# Altium footprint library BARKO_PCBLIB.PcbLib: 531 footprints (part 33 of 34)
Each footprint in its own frame and in the unit in brackets; x right, y up, seen from the top. Pads: shape width x height; smd on the part's side, far side on the other; paste and mask are expansions set on the pad; w line width, h text height; cw(c..) or ccw(c..) is an arc to the next point about the centre after c.
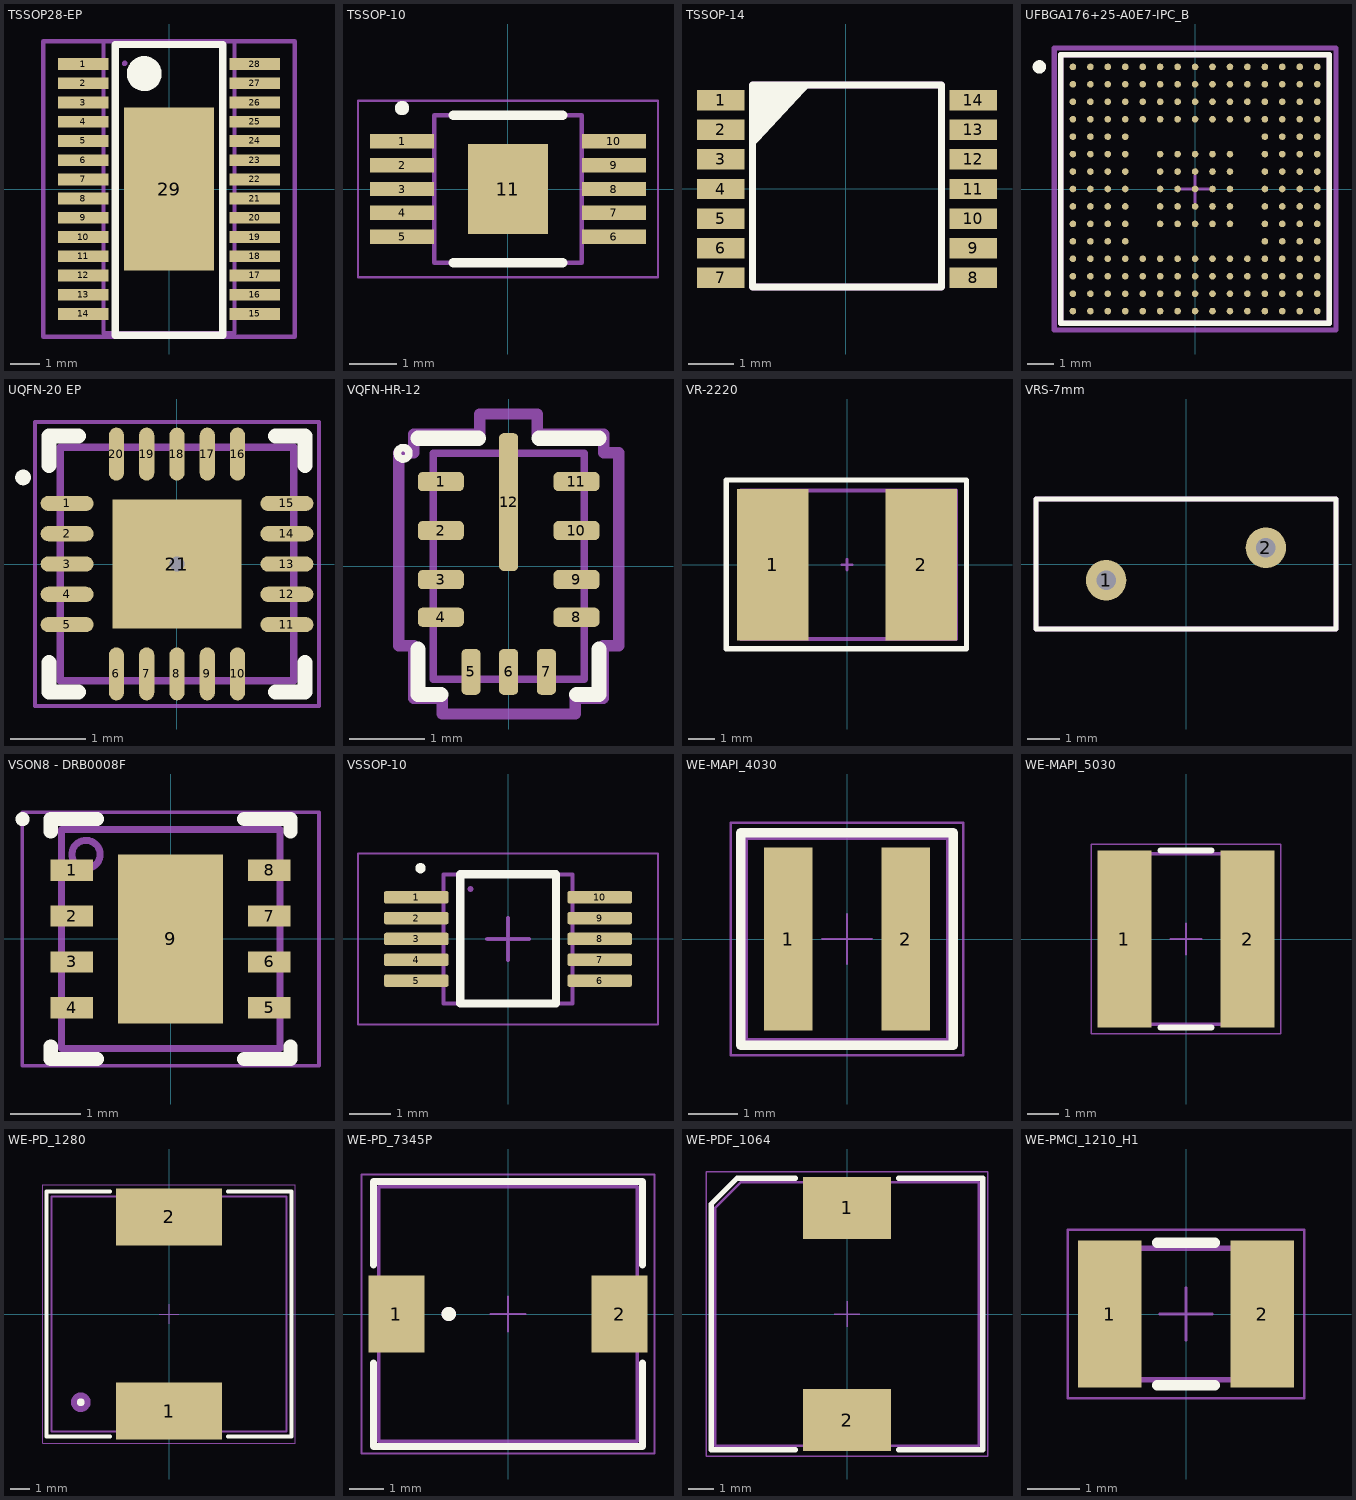
[diagram p32: the footprints below, top view; thin cyan lines are the x and y axes]

## TSSOP28-EP [mil]
height 47.24
pads (29):
  rect 68x16 smd mask+1.97: 1(-116,169) 2(-116,143) 3(-116,117) 4(-116,91) 5(-116,65) 6(-116,39) 7(-116,13) 8(-116,-13) 9(-116,-39) 10(-116,-65) 11(-116,-91) 12(-116,-117) 13(-116,-143) 14(-116,-169) 15(116,-169) 16(116,-143) 17(116,-117) 18(116,-91) 19(116,-65) 20(116,-39) 21(116,-13) 22(116,13) 23(116,39) 24(116,65) 25(116,91) 26(116,117) 27(116,143) 28(116,169)
  rect 122x220 smd paste-109.5 mask+1.97: 29(0,0)
Top Overlay:
  circle w23.62: c-33.46,156.14 r11.81
  lines w10: -72.83,-198 -72.83,195.51 72.83,195.51 72.83,-198 -72.83,-198
Top Paste:
  region: 57.06,-58.94 3.94,-58.94 3.94,-106.06 57.06,-106.06
  region: 57.06,-3.94 3.94,-3.94 3.94,-51.06 57.06,-51.06
  region: 57.06,51.06 3.94,51.06 3.94,3.94 57.06,3.94
  region: 57.06,106.06 3.94,106.06 3.94,58.94 57.06,58.94
  region: -3.94,-58.94 -57.06,-58.94 -57.06,-106.06 -3.94,-106.06
  region: -3.94,-3.94 -57.06,-3.94 -57.06,-51.06 -3.94,-51.06
  region: -3.94,51.06 -57.06,51.06 -57.06,3.94 -3.94,3.94
  region: -3.94,106.06 -57.06,106.06 -57.06,58.94 -3.94,58.94
Mechanical 15:
  lines w6: -170,-200 -108.5,-200 108.5,-200 170,-200 170,200 108.5,200 -108.5,200 -170,200 -170,-200
ASM Top:
  circle w5: c-59.99,170 r1.17
  lines w5: -88.58,-195 88.58,-195 88.58,200 -88.58,200 -88.58,-195
  text ".designator" at -30.5,-3.94 h31.5
3D body "TSSOP28-EP.step": height 47.24, standoff 0, extent -130.32,-192.91 130.32,192.92

## TSSOP-10 [mm] "TSSOP, 10-Leads, Body 3,00x3,00mm, Pitch 0,50mm, Thermal Pad 1,89x1,69mm, IPC Medium Density"
height 1.1
pads (11):
  rect 1.35x0.3 smd mask+0.051: 1(-2.225,1) 2(-2.225,0.5) 3(-2.225,0) 4(-2.225,-0.5) 5(-2.225,-1) 6(2.225,-1) 7(2.225,-0.5) 8(2.225,0) 9(2.225,0.5) 10(2.225,1)
  rect 1.69x1.89 smd mask+0.051: 11(0,0)
Top Overlay:
  circle w0.25: c-2.225,1.7 r0.025
  lines w0.2: -1.15,-1.55 1.15,-1.55 ; -1.15,1.55 1.15,1.55
Mechanical 15:
  lines w0.05: -3.15,-1.85 -3.15,1.85 3.15,1.85 3.15,-1.85 -3.15,-1.85
  lines w0.1: -0.5,0 0.5,0 ; 0,-0.5 0,0.5
ASM Top:
  circle w0.1: c-0.65,0.65 r0.025
  lines w0.1: -1.55,-1.55 -1.55,1.55 1.55,1.55 1.55,-1.55 -1.55,-1.55
  text ".designator" at -0.25,-0.1 h1.2
3D body "User Library-AD5170BRMZ100-ND.STEP": height 0.97, standoff -0.03, extent -2.463,-1.5 2.464,1.5

## TSSOP-14 [mm]
pads (14):
  rect 1.05x0.45 smd mask+0.051: 1(-2.749,1.939) 2(-2.749,1.289) 3(-2.749,0.639) 4(-2.749,-0.011) 5(-2.749,-0.661) 6(-2.749,-1.311) 7(-2.749,-1.961) 8(2.801,-1.961) 9(2.801,-1.311) 10(2.801,-0.661) 11(2.801,-0.011) 12(2.801,0.639) 13(2.801,1.289) 14(2.801,1.939)
Top Overlay:
  region: -0.786,2.275 -2.057,2.275 -2.057,0.901
  lines w0.152: -2.057,-2.17 -2.057,2.275 2.109,2.275 2.109,-2.17 -2.057,-2.17
ASM Top:
  lines w0.152: -2.057,-2.17 2.109,-2.17 2.109,2.275 -2.057,2.275 -2.057,-2.17
  text ".designator" at -0.2,-0.1 h0.8
3D body "TSSOP-14.STEP": height 1.21, standoff 0.01, extent -3.2,-2.5 3.2,2.5

## UFBGA176+25-A0E7-IPC_B [mm]
pads (201):
  round 0.246 smd paste+0 mask+0.05: A1(-4.55,4.55) A2(-3.9,4.55) A3(-3.25,4.55) A4(-2.6,4.55) A5(-1.95,4.55) A6(-1.3,4.55) A7(-0.65,4.55) A8(0,4.55) A9(0.65,4.55) A10(1.3,4.55) A11(1.95,4.55) A12(2.6,4.55) A13(3.25,4.55) A14(3.9,4.55) A15(4.55,4.55) B1(-4.55,3.9) B2(-3.9,3.9) B3(-3.25,3.9) B4(-2.6,3.9) B5(-1.95,3.9) B6(-1.3,3.9) B7(-0.65,3.9) B8(0,3.9) B9(0.65,3.9) B10(1.3,3.9) B11(1.95,3.9) B12(2.6,3.9) B13(3.25,3.9) B14(3.9,3.9) B15(4.55,3.9) C1(-4.55,3.25) C2(-3.9,3.25) C3(-3.25,3.25) C4(-2.6,3.25) C5(-1.95,3.25) C6(-1.3,3.25) C7(-0.65,3.25) C8(0,3.25) C9(0.65,3.25) C10(1.3,3.25) C11(1.95,3.25) C12(2.6,3.25) C13(3.25,3.25) C14(3.9,3.25) C15(4.55,3.25) D1(-4.55,2.6) D2(-3.9,2.6) D3(-3.25,2.6) D4(-2.6,2.6) D5(-1.95,2.6) D6(-1.3,2.6) D7(-0.65,2.6) D8(0,2.6) D9(0.65,2.6) D10(1.3,2.6) D11(1.95,2.6) D12(2.6,2.6) D13(3.25,2.6) D14(3.9,2.6) D15(4.55,2.6) E1(-4.55,1.95) E2(-3.9,1.95) E3(-3.25,1.95) E4(-2.6,1.95) E12(2.6,1.95) E13(3.25,1.95) E14(3.9,1.95) E15(4.55,1.95) F1(-4.55,1.3) F2(-3.9,1.3) F3(-3.25,1.3) F4(-2.6,1.3) F6(-1.3,1.3) F7(-0.65,1.3) F8(0,1.3) F9(0.65,1.3) F10(1.3,1.3) F12(2.6,1.3) F13(3.25,1.3) F14(3.9,1.3) F15(4.55,1.3) G1(-4.55,0.65) G2(-3.9,0.65) G3(-3.25,0.65) G4(-2.6,0.65) G6(-1.3,0.65) G7(-0.65,0.65) G8(0,0.65) G9(0.65,0.65) G10(1.3,0.65) G12(2.6,0.65) G13(3.25,0.65) G14(3.9,0.65) G15(4.55,0.65) H1(-4.55,0) H2(-3.9,0) H3(-3.25,0) H4(-2.6,0) H6(-1.3,0) H7(-0.65,0) H8(0,0) H9(0.65,0) H10(1.3,0) H12(2.6,0) H13(3.25,0) H14(3.9,0) H15(4.55,0) J1(-4.55,-0.65) J2(-3.9,-0.65) J3(-3.25,-0.65) J4(-2.6,-0.65) J6(-1.3,-0.65) J7(-0.65,-0.65) J8(0,-0.65) J9(0.65,-0.65) J10(1.3,-0.65) J12(2.6,-0.65) J13(3.25,-0.65) J14(3.9,-0.65) J15(4.55,-0.65) K1(-4.55,-1.3) K2(-3.9,-1.3) K3(-3.25,-1.3) K4(-2.6,-1.3) K6(-1.3,-1.3) K7(-0.65,-1.3) K8(0,-1.3) K9(0.65,-1.3) K10(1.3,-1.3) K12(2.6,-1.3) K13(3.25,-1.3) K14(3.9,-1.3) K15(4.55,-1.3) L1(-4.55,-1.95) L2(-3.9,-1.95) L3(-3.25,-1.95) L4(-2.6,-1.95) L12(2.6,-1.95) L13(3.25,-1.95) L14(3.9,-1.95) L15(4.55,-1.95) M1(-4.55,-2.6) M2(-3.9,-2.6) M3(-3.25,-2.6) M4(-2.6,-2.6) M5(-1.95,-2.6) M6(-1.3,-2.6) M7(-0.65,-2.6) M8(0,-2.6) M9(0.65,-2.6) M10(1.3,-2.6) M11(1.95,-2.6) M12(2.6,-2.6) M13(3.25,-2.6) M14(3.9,-2.6) M15(4.55,-2.6) N1(-4.55,-3.25) N2(-3.9,-3.25) N3(-3.25,-3.25) N4(-2.6,-3.25) N5(-1.95,-3.25) N6(-1.3,-3.25) N7(-0.65,-3.25) N8(0,-3.25) N9(0.65,-3.25) N10(1.3,-3.25) N11(1.95,-3.25) N12(2.6,-3.25) N13(3.25,-3.25) N14(3.9,-3.25) N15(4.55,-3.25) P1(-4.55,-3.9) P2(-3.9,-3.9) P3(-3.25,-3.9) P4(-2.6,-3.9) P5(-1.95,-3.9) P6(-1.3,-3.9) P7(-0.65,-3.9) P8(0,-3.9) P9(0.65,-3.9) P10(1.3,-3.9) P11(1.95,-3.9) P12(2.6,-3.9) P13(3.25,-3.9) P14(3.9,-3.9) P15(4.55,-3.9) R1(-4.55,-4.55) R2(-3.9,-4.55) R3(-3.25,-4.55) R4(-2.6,-4.55) R5(-1.95,-4.55) R6(-1.3,-4.55) R7(-0.65,-4.55) R8(0,-4.55) R9(0.65,-4.55) R10(1.3,-4.55) R11(1.95,-4.55) R12(2.6,-4.55) R13(3.25,-4.55) R14(3.9,-4.55) R15(4.55,-4.55)
Top Overlay:
  circle w0.25: c-5.8,4.55 r0.125
  lines w0.2: -5,-5 -5,5 5,5 5,-5 -5,-5
Mechanical 13:
  lines w0.2: -5,-5 -5,5 5,5 5,-5 -5,-5
Mechanical 15:
  lines w0.2: -5.25,-5.25 -5.25,5.25 5.25,5.25 5.25,-5.25 -5.25,-5.25
Mechanical 16:
  lines w0.1: -0.5,0 0.5,0 ; 0,-0.5 0,0.5
ASM Top:
  lines w0.15: -5,-5 5,-5 5,5 -5,5 -5,-5
  text ".designator" at 0,0 h0.8
3D body "IC_STMicroelectronics_STM32H743IIK6_eec.STEP": height 0.6, standoff 0, extent -5,-5 5,5

## UQFN-20 EP [mm] "QFN, 20-Leads, Body 3x3mm, , Thermal Pad 1.7x1.7mm, IPC High Density"
height 0.6
pads (21):
  oval 0.7x0.2 smd mask+0.05: 1(-1.45,0.8) 2(-1.45,0.4) 3(-1.45,0) 4(-1.45,-0.4) 5(-1.45,-0.8) 11(1.45,-0.8) 12(1.45,-0.4) 13(1.45,0) 14(1.45,0.4) 15(1.45,0.8)
  oval 0.2x0.7 smd mask+0.05: 6(-0.8,-1.45) 7(-0.4,-1.45) 8(0,-1.45) 9(0.4,-1.45) 10(0.8,-1.45) 16(0.8,1.45) 17(0.4,1.45) 18(0,1.45) 19(-0.4,1.45) 20(-0.8,1.45)
  rect 1.7x1.7 smd mask+0.05: 21(0,0)
via 0,0 diameter 0.5 hole 0.2
Top Overlay:
  circle w0.1: c-2.032,1.143 r0.054
  lines w0.2: -1.69,-1.3 -1.69,-1.69 -1.3,-1.69 ; -1.69,1.3 -1.69,1.69 -1.3,1.69 ; 1.3,-1.69 1.69,-1.69 1.69,-1.3 ; 1.3,1.69 1.69,1.69 1.69,1.3
Mechanical 15:
  lines w0.05: -1.875,-1.875 -1.875,1.875 1.875,1.875 1.875,-1.875 -1.875,-1.875
  lines w0.1: -0.5,0 0.5,0 ; 0,-0.5 0,0.5
ASM Top:
  lines w0.1: -1.54,-1.54 -1.54,1.54 1.54,1.54 1.54,-1.54 -1.54,-1.54
  text ".designator" at -0.5,-0.3 h1.2
3D body: height 0.6, standoff 0, extent -1.54,-1.54 1.54,1.54

## VQFN-HR-12 [mil] "RNX0012B"
height 35.43
pads (12):
  rrect50% 24x10 smd paste+0 mask+2: 1(-35.43,44.29) 2(-35.43,18.7) 3(-35.43,-6.89) 4(-35.43,-26.57) 8(35.43,-26.57) 9(35.43,-6.89) 10(35.43,18.7) 11(35.43,44.29)
  rrect50% 10x24 smd paste+0 mask+2: 5(-19.68,-55.12) 6(0,-55.12) 7(19.68,-55.12)
  rrect50% 10x72 smd paste+0 mask+3: 12(0,33.58)
Top Overlay:
  circle w3.94: c-55.12,59.06 r3
  lines w7.87: -47.24,-43.31 -47.24,-66.93 -35.43,-66.93 ; -47.24,66.93 -15.75,66.93 ; 15.75,66.93 47.24,66.93 ; 35.43,-66.93 47.24,-66.93 47.24,-43.31
Mechanical 15:
  lines w6: -57.43,-41.57 -57.43,59.29 -49.5,59.29 -49.5,69 -15,69 -15,79.58 15,79.58 15,69 49.56,69 49.55,59.29 57.43,59.29 57.43,-41.57 49.51,-41.57 49.5,-69 34.69,-69 34.69,-77.12 -34.69,-77.12 -34.69,-69 -49.5,-69 -49.5,-41.57 -57.43,-41.57
ASM Top:
  circle w3.94: c-28.38,45.09 r1.96
  lines w3.94: -39.5,-59 -39.5,59 39.5,59 39.5,-59 -39.5,-59
  text ".designator" at -11.81,-7.87 h31.5
3D body "User Library-vqfn_hr_12.step": height 31.89, standoff 0, extent -40.16,-59.84 40.15,59.84

## VR-2220 [mm] "2220, 2-Leads, Body 9.4x5.7mm, Pitch 6.7mm"
height 2.5
pads (2):
  rect 2.7x5.7 smd: 1(-2.8,0) 2(2.8,0)
Top Overlay:
  lines w0.2: -4.55,-3.17 -4.55,3.19 4.5,3.19 4.5,-3.17 -4.55,-3.17
Mechanical 15:
  lines w0.1: -0.2,0 0.2,0 ; 0,-0.2 0,0.2 ; -4.55,-3.17 4.51,-3.17 4.51,3.22 -4.55,3.22 -4.55,-3.17
ASM Top:
  lines w0.15: -4,-2.8 -4,2.8 4.1,2.8 4.1,-2.8 -4,-2.8
  text ".designator" at -0.8,-0.3 h1.5
3D body "WE-VS_2220_VS.stp": height 2.45, standoff -0.05, extent -2.85,-2.48 2.85,2.52

## VRS-7mm [mil]
pads (2):
  round 50 hole 24: 1(-98.5,-20) 2(98.5,20)
Top Overlay:
  lines w6: -185,-80 -185,80 185,80 185,-80 -185,-80
ASM Top:
  lines w6: -185,-80 185,-80 185,80 -185,80 -185,-80
  text ".designator" at -171,10 h31.5
3D body "varistor 7mm.stp": height 437.17, standoff -783.31, extent -176.83,-68.9 177.5,68.9

## VSON8 - DRB0008F [mm] "DRB0008F  THVD1450"
height 1
pads (9):
  rect 0.6x0.3 smd: 1(-1.4,0.975) 2(-1.4,0.325) 3(-1.4,-0.325) 4(-1.4,-0.975) 5(1.4,-0.975) 6(1.4,-0.325) 7(1.4,0.325) 8(1.4,0.975)
  rect 1.49x2.4 smd: 9(0,0)
Top Overlay:
  circle w0.1: c-2.1,1.7 r0.05
  lines w0.2: -1.7,-1.525 -1.7,-1.7 -1.045,-1.7 ; -1.7,1.525 -1.7,1.7 -1.045,1.7 ; 1.045,-1.7 1.7,-1.7 1.7,-1.525 ; 1.045,1.7 1.7,1.7 1.7,1.525
Mechanical 15:
  lines w0.05: -2.105,-1.8 -2.105,1.8 2.105,1.8 2.105,-1.8 -2.105,-1.8
  lines w0.1: -0.5,0 0.5,0 ; 0,-0.5 0,0.5
ASM Top:
  circle w0.1: c-1.2,1.2 r0.2
  lines w0.1: -1.55,-1.55 1.55,-1.55 1.55,1.55 -1.55,1.55 -1.55,-1.55
  text ".designator" at 0.5,-1.2 h0.8
3D body "VSON8 - DRB0008F.step": height 1, standoff 0, extent -1.6,-1.55 1.6,1.55

## VSSOP-10 [mm] "TSSOP, 10-Leads, Body 3x3mm, Pitch 0.5mm, IPC Low Density"
height 1.09
pads (10):
  rrect33% 1.55x0.3 smd mask+0.05: 1(-2.2,1) 2(-2.2,0.5) 3(-2.2,0) 4(-2.2,-0.5) 5(-2.2,-1) 6(2.2,-1) 7(2.2,-0.5) 8(2.2,0) 9(2.2,0.5) 10(2.2,1)
Top Overlay:
  circle w0.25: c-2.1,1.7 r0
  lines w0.2: -1.15,-1.55 -1.15,1.55 1.15,1.55 1.15,-1.55 -1.15,-1.55
Mechanical 15:
  lines w0.05: -3.6,-2.051 -3.6,2.049 3.6,2.049 3.6,-2.051 -3.6,-2.051
  lines w0.1: -0.5,-0.001 0.5,-0.001 ; 0,-0.501 0,0.499
ASM Top:
  circle w0.14: c-0.9,1.2 r0
  lines w0.1: -1.55,-1.55 1.55,-1.55 1.55,1.55 -1.55,1.55 -1.55,-1.55
3D body "DGS0010AakaMUB10A.stp": height 0.94, standoff -0.02, extent -2.451,-1.5 2.451,1.497
3D body: height 1.09, standoff 0.06, extent -1.55,-1.55 1.55,1.55

## WE-MAPI_4030 [mm] "SMT Shielded Power Inductor, body 4.1x4.1mm"
height 3.1
pads (2):
  rect 0.98x3.7 smd: 1(-1.185,0) 2(1.185,0)
Top Overlay:
  lines w0.2: -2.15,-2.15 -2.15,2.15 2.15,2.15 2.15,-2.15 -2.15,-2.15
Mechanical 15:
  lines w0.05: -0.5,0 0.5,0 ; 0,-0.5 0,0.5 ; -2.35,-2.35 2.35,-2.35 2.35,2.35 -2.35,2.35 -2.35,-2.35
ASM Top:
  lines w0.1: -2.05,-2.05 2.05,-2.05 2.05,2.05 -2.05,2.05 -2.05,-2.05
  text ".designator" at -0.4,-0.061 h0.8
3D body "74438357022_Download_WE-MAPI-4030_stp_rev1.stp": height 3.1, standoff 0, extent -2.05,-2.05 2.05,2.05

## WE-MAPI_5030 [mm] "SMD Power Inductor, 2-leads, body 5.6x5.6mm"
height 3.1
pads (2):
  rect 1.7x5.6 smd: 1(-1.95,0) 2(1.95,0)
Top Overlay:
  lines w0.2: -0.8,-2.8 0.8,-2.8 ; -0.8,2.8 0.8,2.8
Mechanical 15:
  lines w0.05: -0.5,0 0.5,0 ; 0,-0.5 0,0.5 ; -3,-3 3,-3 3,3 -3,3 -3,-3
ASM Top:
  lines w0.1: -2.7,-2.7 2.7,-2.7 2.7,2.7 -2.7,2.7 -2.7,-2.7
  text ".designator" at 0,0 h0.8
3D body "74438367xxx_5030.stp": height 3.1, standoff 0, extent -2.7,-2.7 2.7,2.7

## WE-PD_1280 [mm] "SMT Shielded Power Inductor, 2-leads, body 12x12mm"
height 8
pads (2):
  rect 5.4x2.9 smd: 1(0,-4.95) 2(0,4.95)
Top Overlay:
  circle w0.3: c-4.5,-4.5 r0.05
  lines w0.2: -3,-6.25 -6.25,-6.25 -6.25,6.25 -3,6.25 ; 3,-6.25 6.25,-6.25 6.25,6.25 3,6.25
Mechanical 15:
  lines w0.05: -0.5,0 0.5,0 ; 0,-0.5 0,0.5 ; -6.45,-6.6 -6.45,6.6 6.45,6.6 6.45,-6.6 -6.45,-6.6
ASM Top:
  circle w0.5: c-4.5,-4.5 r0.25
  lines w0.1: -6,-6 6,-6 6,6 -6,6 -6,-6
  text ".designator" at -0.5,-0.161 h0.8
3D body "WE-PD_1280_m-base_744770xxx.stp": height 7.51, standoff 0.05, extent -6,-6 6,6

## WE-PD_7345P [mm] "SMT Shielded Power Inductor, 2-leads, body 7.3x7.4mm"
height 4.5
pads (2):
  rect 1.6x2.2 smd: 1(-3.2,0) 2(3.2,0)
Top Overlay:
  circle w0.4: c-1.7,0 r0.005
  lines w0.2: -3.85,-1.4 -3.85,-3.8 3.85,-3.8 3.85,-1.4 ; -3.85,1.4 -3.85,3.8 3.85,3.8 3.85,1.4
Mechanical 15:
  lines w0.05: -0.5,0 0.5,0 ; 0,-0.5 0,0.5 ; -4.2,-4 4.2,-4 4.2,4 -4.2,4 -4.2,-4
ASM Top:
  circle w0.4: c-1.7,0 r0.005
  lines w0.1: -3.7,-3.65 3.7,-3.65 3.7,3.65 -3.7,3.65 -3.7,-3.65
  text ".designator" at 0,0 h0.8
3D body "WE-PD_7345_clip_7447773xxx.stp": height 4.22, standoff 0, extent -3.65,-3.651 3.65,3.651

## WE-PDF_1064 [mm] "SMD Shielded Power Inductor, body 10.2x10.2mm"
height 6.4
pads (2):
  rect 3.4x2.4 smd: 1(0,4.1) 2(0,-4.1)
Top Overlay:
  lines w0.2: -2,-5.25 -5.25,-5.25 -5.25,4.25 -4.25,5.25 -2,5.25 ; 2,-5.25 5.25,-5.25 5.25,5.25 2,5.25
Mechanical 15:
  lines w0.05: -0.5,0 0.5,0 ; 0,-0.5 0,0.5 ; -5.45,-5.5 5.45,-5.5 5.45,5.5 -5.45,5.5 -5.45,-5.5
ASM Top:
  lines w0.1: -5.1,-5.1 -5.1,4.1 -4.1,5.1 5.1,5.1 5.1,-5.1 -5.1,-5.1
  text ".designator" at -0.5,-0.2 h1.5
3D body "7447798xxx.stp": height 6.4, standoff 0, extent -5.1,-5.1 5.1,5.1

## WE-PMCI_1210_H1 [mm] "Power Molded Chip Inductor, body 3.2x2.5mm"
height 1
pads (2):
  rect 1.2x2.8 smd: 1(-1.45,0) 2(1.45,0)
Top Overlay:
  lines w0.2: -0.55,-1.35 0.55,-1.35 ; -0.55,1.35 0.55,1.35
Mechanical 15:
  lines w0.05: -0.5,0 0.5,0 ; 0,-0.5 0,0.5 ; -2.25,-1.6 -2.25,1.6 2.25,1.6 2.25,-1.6 -2.25,-1.6
ASM Top:
  lines w0.1: -1.6,-1.25 -1.6,1.25 1.6,1.25 1.6,-1.25 -1.6,-1.25
  text ".designator" at -0.4,-0.2 h0.8
3D body "74479298xxx_1210.stp": height 1, standoff 0, extent -1.6,-1.25 1.6,1.25